# Altium footprint library LegacyRez-Axial Pot.PcbLib: 113 footprints (part 2 of 8)
Each footprint in its own frame and in the unit in brackets; x right, y up, seen from the top. Pads: shape width x height; smd on the part's side, far side on the other; paste and mask are expansions set on the pad; w line width, h text height; cw(c..) or ccw(c..) is an arc to the next point about the centre after c.
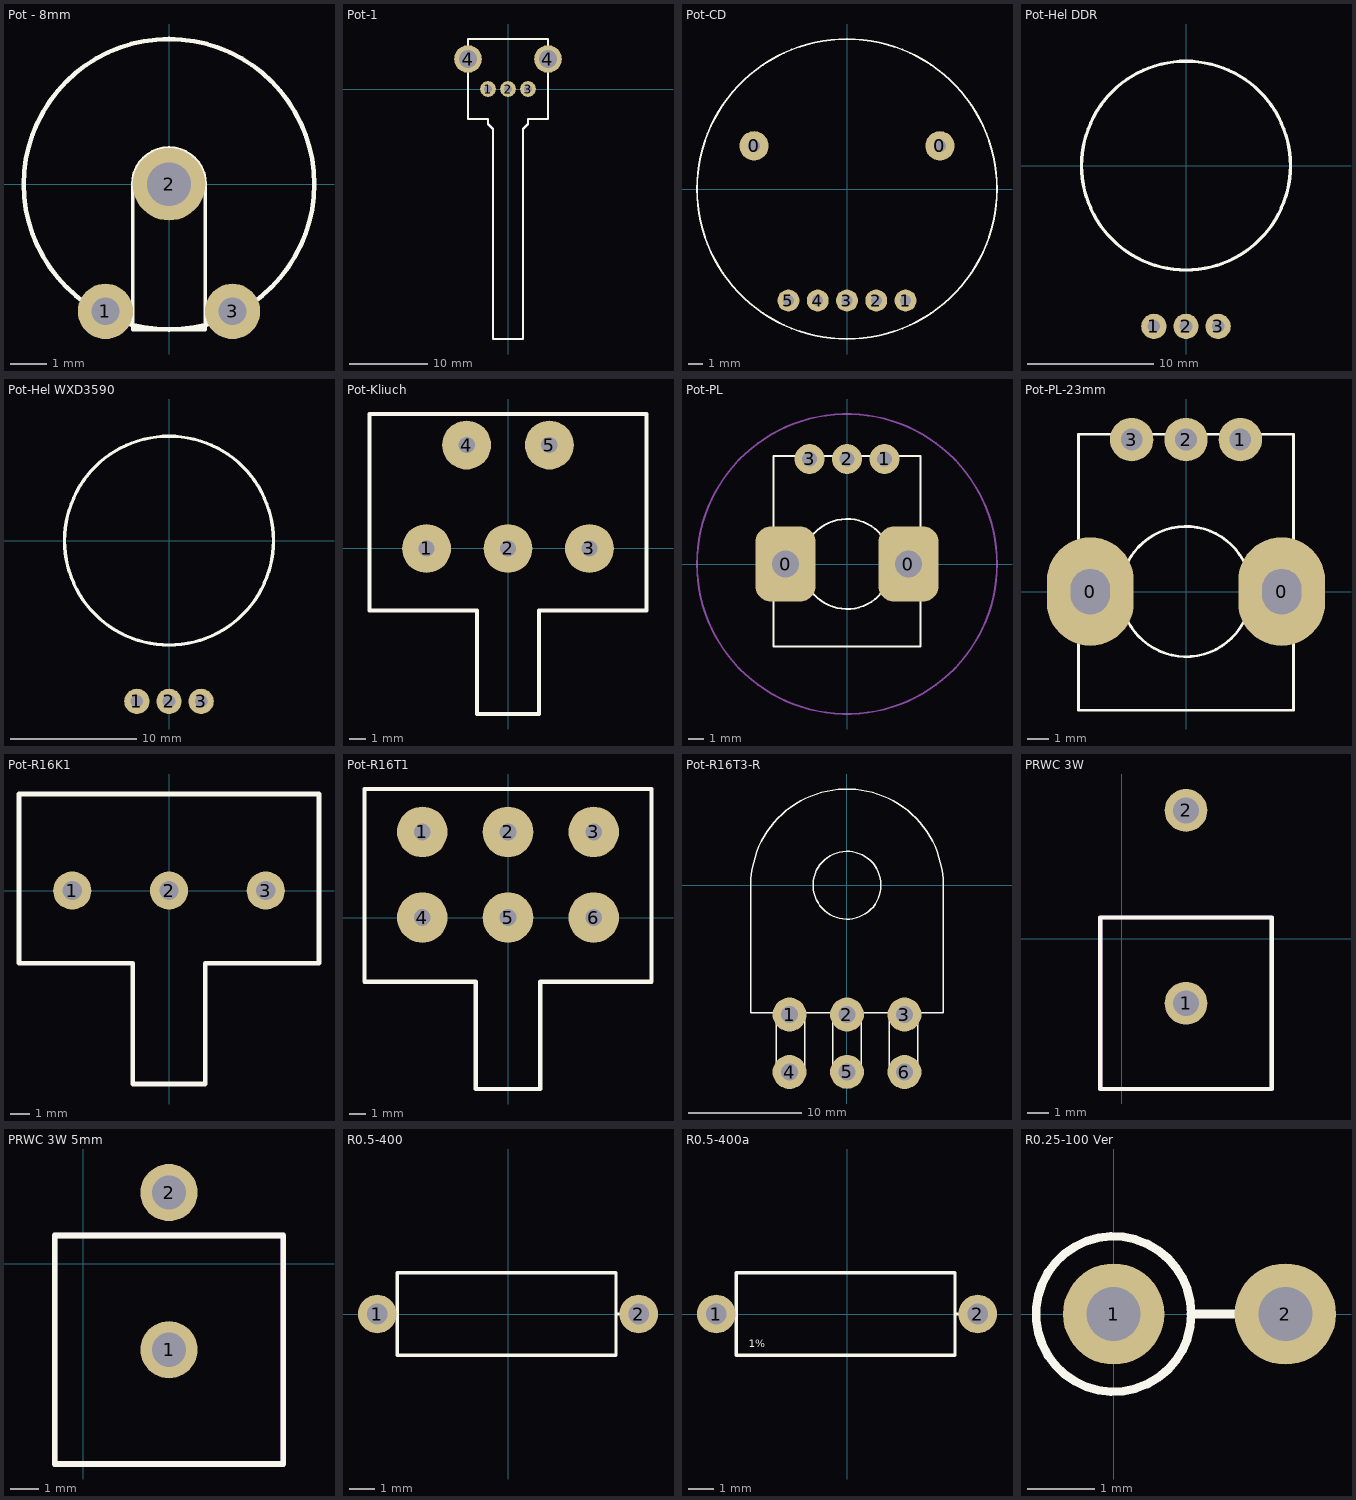
[diagram p1: the footprints below, top view; thin cyan lines are the x and y axes]

## Pot - 8mm [mm]
pads (3):
  round 1.524 hole 0.762: 1(-1.75,-3.5) 3(1.75,-3.5)
  round 2 hole 1.2: 2(0,0)
TopOverlay:
  circle w0.125: c0,0 r4
  lines w0.1: -1,-4 -1,0 cw(c0,0) 0,1 cw(c0,0) 1,0 1,-4 -1,-4
3D body: height 0, standoff 0, extent -4.063,-4.063 4.063,4.063
3D body: height 0, standoff 0, extent -4.001,-4.001 4.001,4.001
3D body: height 0, standoff 0, extent -2.614,-4.364 2.614,1.102
3D body: height 0, standoff 0, extent -4.063,-4.364 4.063,4.063
3D body: height 0, standoff 0, extent -3.999,-3.999 3.999,3.999
3D body: height 4.1, standoff 0.9, extent -3.995,-3.999 4,3.999

## Pot-1 [mm]
pads (5):
  round 2 hole 1: 1(-2.54,0) 2(0,0) 3(2.54,0)
  round 3.5 hole 2.235: 4(-5.08,3.81) 4(5.08,3.81)
TopOverlay:
  lines w0.254: -5.08,-3.81 -2.54,-3.81 -2.54,-4.445 -1.905,-5.08 -1.905,-31.75 1.905,-31.75 1.905,-5.08 2.54,-4.445 2.54,-3.81 5.08,-3.81 5.08,6.35 -5.08,6.35 -5.08,-3.81

## Pot-CD [mm]
pads (7):
  round 2 hole 0.813: 0(-6.35,2.95) 0(6.35,2.95)
  round 1.5 hole 0.75: 1(4,-7.62) 2(2,-7.62) 3(0,-7.62) 4(-2,-7.62) 5(-4,-7.62)
TopOverlay:
  circle w0.127: c0,0 r10.25
3D body "Pot-CD.STEP": height 3.6, standoff -2.5, extent -10.249,-10.249 10.249,10.249

## Pot-Hel DDR [mm]
pads (3):
  round 2 hole 1: 1(-2.54,-12.7) 2(0,-12.7) 3(2.54,-12.7)
TopOverlay:
  circle w0.254: c0,0 r8.25
BottomOverlay:
  circle w0.254: c0,0 r10
3D body "Pot-DDR Hel.STEP": height 46, standoff -18.5, extent -10.5,-10.5 10.5,10.5

## Pot-Hel WXD3590 [mm]
pads (3):
  round 2 hole 1: 1(-2.54,-12.7) 2(0,-12.7) 3(2.54,-12.7)
TopOverlay:
  circle w0.254: c0,0 r8.25
BottomOverlay:
  circle w0.254: c0,0 r10
3D body "Pot WXD3590.STEP": height 20, standoff -20, extent -11.25,-11.25 11.25,15.491

## Pot-Kliuch [mm]
pads (5):
  round 3 hole 1: 1(-5,0) 2(0,0) 3(5,0) 4(-2.54,6.35) 5(2.54,6.35)
TopOverlay:
  lines w0.254: -8.5,-3.81 -1.905,-3.81 -1.905,-10.16 1.905,-10.16 1.905,-3.81 8.5,-3.81 8.5,8.255 -8.5,8.255 -8.5,-3.81

## Pot-PL [mm]
pads (5):
  rrect50% 4x5 hole 1.8 square: 0(-4.1,0) 0(4.1,0)
  round 2 hole 1: 1(2.5,7) 2(0,7) 3(-2.5,7)
TopOverlay:
  circle w0.127: c0,0 r3
  lines w0.127: -4.9,-5.5 4.9,-5.5 4.9,7.21 -4.9,7.21 -4.9,-5.5
Mechanical1:
  circle w0.127: c0,0 r10
3D body "Pot Pl-23mm.STEP": height 26.56, standoff -2.5, extent -4.9,-5.5 4.9,7.21

## Pot-PL-23mm [mm]
pads (5):
  oval 4x5 hole 1.8 slot 2.083 at 90 deg: 0(-4.407,0) 0(4.407,0)
  round 2 hole 1: 1(2.5,7) 2(0,7) 3(-2.5,7)
TopOverlay:
  circle w0.127: c0,0 r3
  lines w0.127: -4.953,-5.461 -4.953,7.239 4.953,7.239 4.953,-5.461 -4.953,-5.461
3D body "Pot Pl-23mm.STEP": height 26.56, standoff -2.5, extent -4.9,-5.5 4.9,7.21

## Pot-R16K1 [mm]
pads (3):
  round 2 hole 1: 1(-5.08,0) 2(0,0) 3(5.08,0)
TopOverlay:
  lines w0.254: -7.874,-3.81 -7.874,5.08 7.874,5.08 7.874,-3.81 1.905,-3.81 1.905,-10.16 -1.905,-10.16 -1.905,-3.81 -7.874,-3.81
3D body "Pot R16K1 Mono.STEP": height 24.62, standoff 0, extent -7.874,-20.605 7.874,4.953

## Pot-R16T1 [mm]
pads (6):
  round 3 hole 1: 1(-5.08,5.08) 2(0,5.08) 3(5.08,5.08) 4(-5.08,0) 5(0,0) 6(5.08,0)
TopOverlay:
  lines w0.254: -8.5,-3.81 -1.905,-3.81 -1.905,-10.16 1.905,-10.16 1.905,-3.81 8.5,-3.81 8.5,7.62 -8.5,7.62 -8.5,-3.81
3D body "Pot R16T1 Stereo.STEP": height 21.2, standoff -3.3, extent -8.5,-33.35 8.5,7.5

## Pot-R16T3-R [mm]
pads (6):
  round 3 hole 1.5: 1(-5.08,-11.43) 2(0,-11.43) 3(5.08,-11.43) 4(-5.08,-16.51) 5(0,-16.5) 6(5.08,-16.51)
TopOverlay:
  circle w0.127: c0,0 r3
  lines w0.127: -6.25,-11.25 -6.25,-16.25 -3.75,-16.25 -3.75,-11.25 ; -1.25,-11.25 -1.25,-16.25 1.25,-16.25 1.25,-11.25 ; 3.75,-11.25 3.75,-16.25 6.25,-16.25 6.25,-11.25 ; -8.5,-11.25 -8.5,0 cw(c0,0) 8.5,0 8.5,-11.25 -8.5,-11.25
3D body "Pot R16T3-R Stereo.STEP": height 25, standoff -3.96, extent -8.5,-16.5 8.5,8.5

## PRWC 3W [mm]
height 20
pads (2):
  round 2 hole 1.2 paste-25.4: 1(3,-3) 2(3,6)
TopOverlay:
  lines w0.2: -1,-7 -1,1 7,1 7,-7 -1,-7
Mechanical3:
  text ".Designator / .Comment" at 1.091,-1.762 h1.02
Mechanical13:
  lines w0.2: -1,-7 -1,1 7,1 ; -1,-7 -1,-7 ; -1,-7 7,-7 ; 7,-7 7,-7 ; 7,-7 7,1 ; 7,1 7,1
3D body: height 21, standoff 1, extent -1,-7 7,1

## PRWC 3W 5mm [mm]
height 20
pads (2):
  round 2 hole 1.2 paste-25.4: 1(3,-3) 2(3,2.5)
TopOverlay:
  lines w0.2: -1,-7 7,-7 7,1 -1,1 -1,-7
Mechanical3:
  text ".Designator / .Comment" at 1.091,-1.762 h1.02
Mechanical13:
  lines w0.2: -1,-7 7,-7 ; -1,-7 -1,-7 ; -1,-7 -1,1 7,1 ; 7,-7 7,1 ; 7,-7 7,-7 ; 7,1 7,1
3D body: height 21, standoff 1, extent -1,-7 7,1

## R0.5-400 [mm]
pads (2):
  round 1.5 hole 0.8: 1(-5.08,0) 2(5.08,0)
TopOverlay:
  lines w0.127: -5.08,0 -4.3,0 ; 4.2,0 5.08,0 ; -4.3,-1.6 4.2,-1.6 4.2,1.6 -4.3,1.6 -4.3,-1.6
3D body "Res-(0.5W)-400.STEP": height 3.2, standoff -2.54, extent -5.38,-1.6 5.38,1.6

## R0.5-400a [mm]
pads (2):
  round 1.5 hole 0.8: 1(-5.08,0) 2(5.08,0)
TopOverlay:
  lines w0.127: -5.08,0 -4.3,0 ; 4.2,0 5.08,0 ; -4.3,-1.6 -4.3,1.6 4.2,1.6 4.2,-1.6 -4.3,-1.6
  text "1%" at -3.81,-1.397 h0.5
3D body "Res-(0.5W)-400a.STEP": height 3.2, standoff -2.54, extent -5.38,-1.6 5.38,1.6

## R0.25-100 Ver [mm]
pads (2):
  round 1.5 hole 0.8: 1(0,0) 2(2.54,0)
TopOverlay:
  circle w0.127: c0,0 r1.15
  lines w0.127: 1.143,0 2.54,0
3D body "Res (0.25W)-100 Ver.STEP": height 8.07, standoff -2.54, extent -1.15,-1.15 2.84,1.15